# Altium footprint library custom-case.PcbLib: 381 footprints (part 20 of 24)
Each footprint in its own frame and in the unit in brackets; x right, y up, seen from the top. Pads: shape width x height; smd on the part's side, far side on the other; paste and mask are expansions set on the pad; w line width, h text height; cw(c..) or ccw(c..) is an arc to the next point about the centre after c.
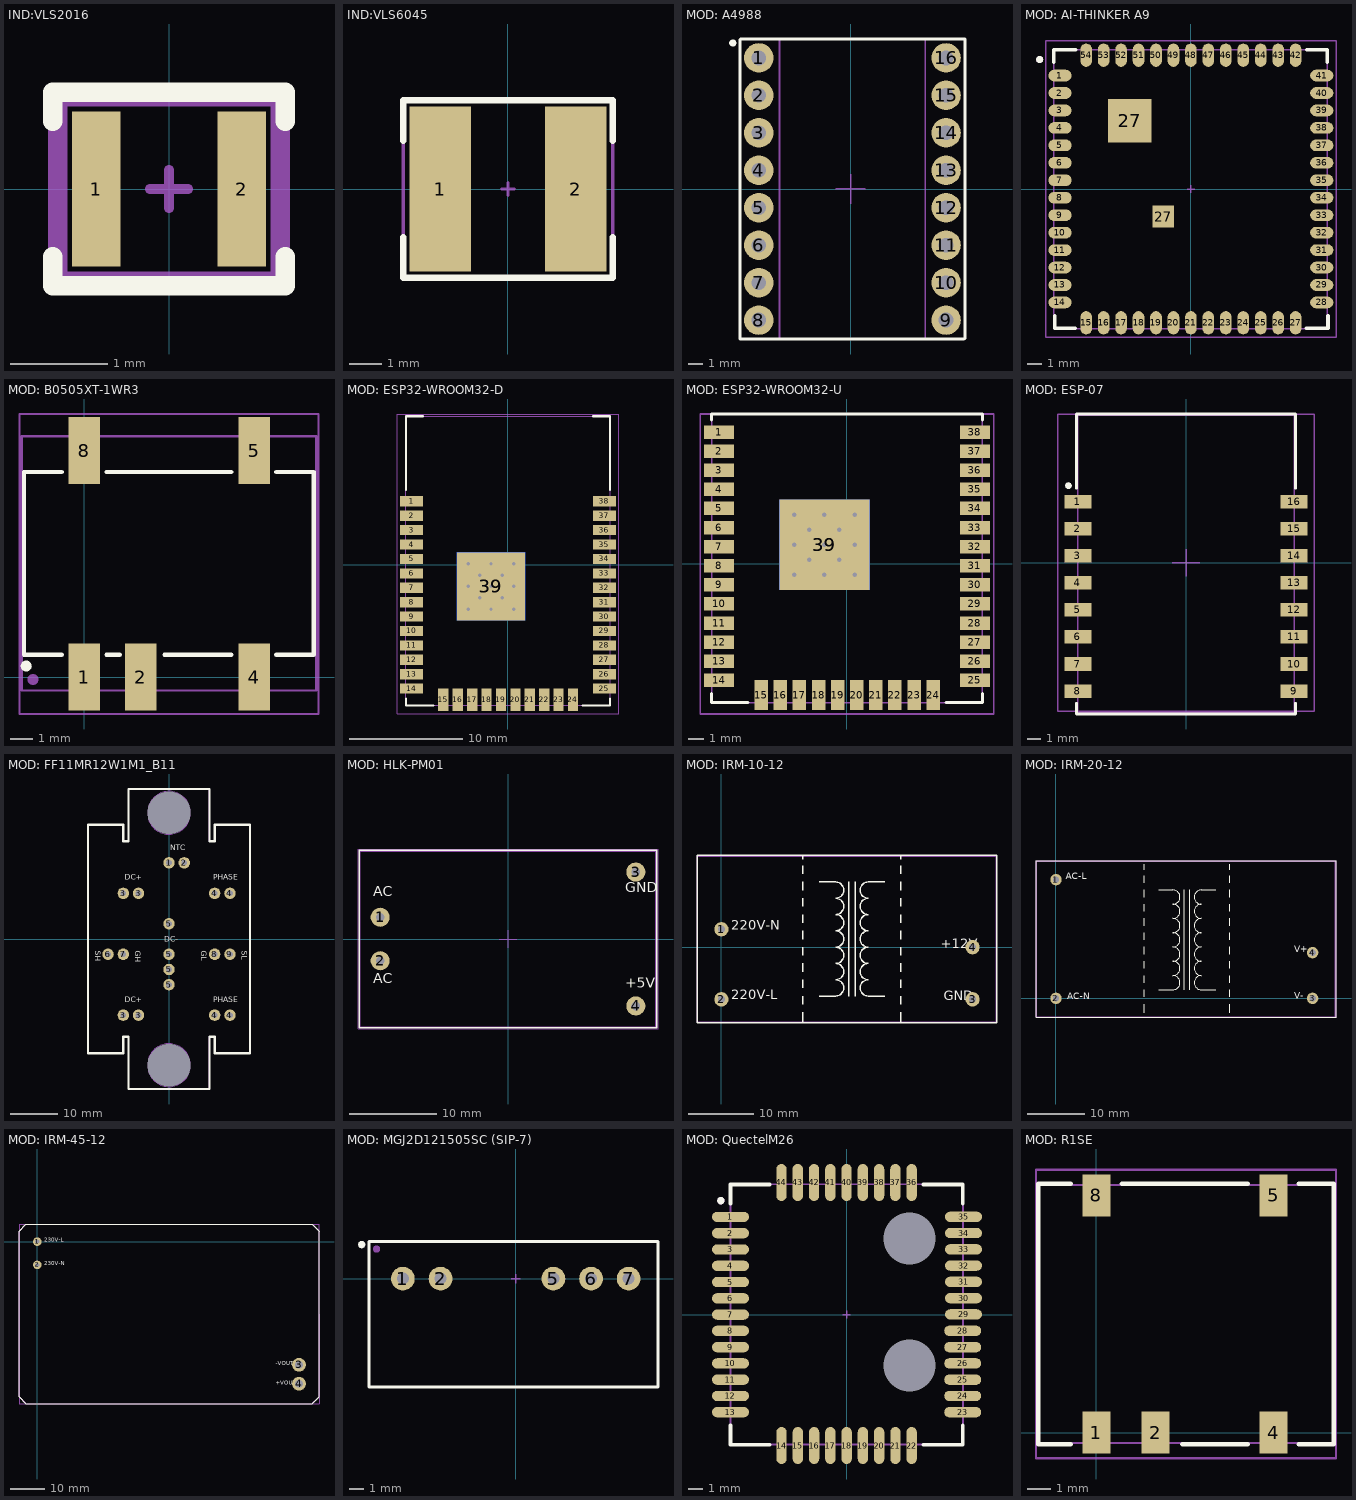
[diagram p19: the footprints below, top view; thin cyan lines are the x and y axes]

## IND:VLS2016 [mm]
pads (2):
  rect 0.5x1.6 smd: 1(-0.75,0) 2(0.75,0)
Top Overlay:
  lines w0.2: -1.2,-0.7 -1.2,-1 1.2,-1 1.2,-0.7 ; -1.2,0.7 -1.2,1 1.2,1 1.2,0.7
Top Assy:
  lines w0.1: -1.1,-0.9 1.1,-0.9 1.1,0.9 -1.1,0.9 -1.1,-0.9
Size Area:
  lines w0.1: -0.2,0 0.2,0 ; 0,-0.2 0,0.2 ; -1.2,-1 1.2,-1 1.2,1 -1.2,1 -1.2,-1
3D body "vls201610hbx-1.step": height 0.99, standoff -0.01, extent -1,-0.8 1,0.8

## IND:VLS6045 [mm]
pads (2):
  rect 1.9x5.1 smd: 1(-2.1,0) 2(2.1,0)
Top Overlay:
  lines w0.2: -3.25,-1.5 -3.25,-2.75 3.25,-2.75 3.25,-1.5 ; -3.25,1.494 -3.25,2.75 3.25,2.75 3.25,1.5
Top Assy:
  lines w0.1: -3.25,2.75 -3.25,-2.75 3.25,-2.75 3.25,2.75 -3.241,2.75
Size Area:
  lines w0.1: -0.2,0 0.2,0 ; 0,-0.2 0,0.2 ; -3.25,-2.75 3.25,-2.75 3.25,2.75 -3.25,2.75 -3.25,-2.75
3D body "vls6045ex.step": height 4.49, standoff -0.01, extent -3,-3 3,3

## MOD: A4988 [mm]
pads (17):
  round 2 hole 1: 1(-6.24,8.89) 2(-6.24,6.35) 3(-6.24,3.81) 4(-6.24,1.27) 5(-6.24,-1.27) 6(-6.24,-3.81) 7(-6.24,-6.35) 8(-6.24,-8.89) 9(6.46,-8.89) 10(6.46,-6.35) 11(6.46,-3.81) 12(6.46,-1.27) 13(6.46,1.27) 14(6.46,3.81) 15(6.46,6.35) 16(6.46,8.89)
  round 0.5 on Top Overlay: ""(-8,9.9)
Top Overlay:
  lines w0.2: -7.51,10.14 -7.51,-10.16 7.69,-10.16 ; -7.47,10.16 7.73,10.16 7.73,-10.14
Top Assy:
  lines w0.1: -7.503,-10.165 -4.834,-10.165 -4.834,10.152 -7.503,10.152 -7.503,-10.165 ; 5.054,-10.152 5.054,10.165 7.723,10.165 7.723,-10.152 5.054,-10.152
Size Area:
  lines w0.1: -1.02,0.001 0.98,0.001 ; -0.02,-0.999 -0.02,1.001 ; 5.06,10.16 7.734,10.16 ; 5.06,10.171 5.06,-10.171 7.734,-10.171 7.734,10.171 ; -7.514,-10.171 -7.514,10.158 -4.84,10.158 -4.84,-10.171 -7.514,-10.171
3D body "User Library-A4988.STEP": height 8.54, standoff -1.62, extent -7.53,-10.16 7.71,10.16

## MOD: AI-THINKER A9 [mm]
pads (58):
  oval 1.6x0.8 smd: 1(-9,7.8) 2(-9,6.6) 3(-9,5.4) 4(-9,4.2) 5(-9,3) 6(-9,1.8) 7(-9,0.6) 8(-9,-0.6) 9(-9,-1.8) 10(-9,-3) 11(-9,-4.2) 12(-9,-5.4) 13(-9,-6.6) 14(-9,-7.8) 28(9,-7.8) 29(9,-6.6) 30(9,-5.4) 31(9,-4.2) 32(9,-3) 33(9,-1.8) 34(9,-0.6) 35(9,0.6) 36(9,1.8) 37(9,3) 38(9,4.2) 39(9,5.4) 40(9,6.6) 41(9,7.8)
  oval 0.8x1.6 smd: 15(-7.2,-9.2) 16(-6,-9.2) 17(-4.8,-9.2) 18(-3.6,-9.2) 19(-2.4,-9.2) 20(-1.2,-9.2) 21(0,-9.2) 22(1.2,-9.2) 23(2.4,-9.2) 24(3.6,-9.2) 25(4.8,-9.2) 26(6,-9.2) 27(7.2,-9.2) 42(7.2,9.2) 43(6,9.2) 44(4.8,9.2) 45(3.6,9.2) 46(2.4,9.2) 47(1.2,9.2) 48(0,9.2) 49(-1.2,9.2) 50(-2.4,9.2) 51(-3.6,9.2) 52(-4.8,9.2) 53(-6,9.2) 54(-7.2,9.2)
  rect 3x3 smd: 27(-4.2,4.7)
  rect 1.5x1.5 smd: 27(-1.9,-1.9)
  round 0.5 on Mech1: ""(-10.4,8.9)
  round 0.5 on Top Overlay: ""(-10.4,8.9)
Top Overlay:
  lines w0.254: -9.434,8.71 -9.434,9.576 -7.934,9.576 ; -9.366,-8.71 -9.366,-9.576 -7.966,-9.576 ; 7.934,-9.576 9.434,-9.576 9.434,-8.71 ; 7.966,9.576 9.366,9.576 9.366,8.71
Top Assy:
  lines w0.1: -9.434,-9.624 -9.434,9.576 9.366,9.576 9.366,-9.624 -9.434,-9.624
Size Area:
  lines w0.1: -0.25,0 0.25,0 ; 0,-0.25 0,0.25 ; -9.978,-10.189 9.978,-10.189 9.978,10.151 9.978,10.189 -9.978,10.189 -9.978,-10.151 -9.978,-10.189
3D body "a9.step": height 1.8, standoff -0.16, extent -9.4,-9.6 9.4,9.6

## MOD: B0505XT-1WR3 [mm]
pads (7):
  rect 1.4x3 smd: 1(0,0) 2(2.54,0) 4(7.62,0) 5(7.62,10.16) 8(0,10.16)
  round 0.5 on Top Overlay: ""(-2.6,0.5)
  round 0.5 on Mech1: ""(-2.3,-0.1)
Top Overlay:
  lines w0.2: -1,1 -2.7,1 -2.7,9.2 -1,9.2 ; 1,1 1.6,1 ; 1,9.2 6.6,9.2 ; 3.6,1 6.6,1 ; 8.62,1 10.3,1 10.3,9.2 8.62,9.2
Top Assy:
  lines w0.1: -2.8,-0.6 -2.8,10.8 10.4,10.8 10.4,-0.6 -2.8,-0.6
Size Area:
  lines w0.1: -2.897,-1.65 10.5,-1.65 10.5,11.8 0.4,11.8 -2.897,11.8 -2.897,-1.65
3D body "1WR3.STEP": height 7.25, standoff 0, extent -2.8,-0.6 10.4,10.8

## MOD: ESP32-WROOM32-D [mm]
pads (40):
  rect 2x0.9 smd: 1(-8.5,5.6) 2(-8.5,4.33) 3(-8.5,3.06) 4(-8.5,1.79) 5(-8.5,0.52) 6(-8.5,-0.75) 7(-8.5,-2.02) 8(-8.5,-3.29) 9(-8.5,-4.56) 10(-8.5,-5.83) 11(-8.5,-7.1) 12(-8.5,-8.37) 13(-8.5,-9.64) 14(-8.5,-10.91) 25(8.5,-10.91) 26(8.5,-9.64) 27(8.5,-8.37) 28(8.5,-7.1) 29(8.5,-5.83) 30(8.5,-4.56) 31(8.5,-3.29) 32(8.5,-2.02) 33(8.5,-0.75) 34(8.5,0.52) 35(8.5,1.79) 36(8.5,3.06) 37(8.5,4.33) 38(8.5,5.6)
  rect 0.9x2 smd: 15(-5.7,-11.9) 16(-4.43,-11.9) 17(-3.16,-11.9) 18(-1.89,-11.9) 19(-0.62,-11.9) 20(0.65,-11.9) 21(1.92,-11.9) 22(3.19,-11.9) 23(4.46,-11.9) 24(5.73,-11.9)
  rect 6x6 smd far side: 39(-1.5,-1.9)
  rect 6x6 smd: 39(-1.5,-1.9)
via -3.5,-1.9 diameter 0.7 hole 0.3
via -1.5,-3.9 diameter 0.7 hole 0.3
via 0.5,-1.9 diameter 0.7 hole 0.3
via -1.5,0.1 diameter 0.7 hole 0.3
via -3.5,0.1 diameter 0.7 hole 0.3
via -3.5,-3.9 diameter 0.7 hole 0.3
via 0.5,-3.9 diameter 0.7 hole 0.3
via 0.5,0.1 diameter 0.7 hole 0.3
via -0.5,-2.9 diameter 0.7 hole 0.3
via -2.5,-2.9 diameter 0.7 hole 0.3
via -2.5,-0.9 diameter 0.7 hole 0.3
via -0.5,-0.9 diameter 0.7 hole 0.3
via -1.5,-1.9 diameter 0.7 hole 0.3
Top Overlay:
  lines w0.2: -9,-11.8 -9,-12.4 -6.6,-12.4 ; -9,6.6 -9,7.6 -9,13.1 -7.5,13.1 ; 6.6,-12.4 9,-12.4 9,-11.8 ; 7.5,13.1 9,13.1 9,7.6 9,6.6
Top Assy:
  lines w0.1: -9,-12.4 9,-12.4 ; -9,-12.4 -9,13.1 ; -9,-12.4 9,-12.4 ; -9,-12.4 -9,13.1 ; -9,13.1 9,13.1 ; -9,13.1 9,13.1 ; 9,-12.4 9,13.1 ; 9,-12.4 9,13.1
Size Area:
  lines w0.1: -0.25,0.05 0.25,0.05 ; 0,-0.2 0,0.3 ; -9.75,-13.15 -9.75,13.3 9.75,13.3 9.75,-13.15 -9.75,-13.15
3D body "User Library-ESP321.STEP": height 2.91, standoff -0.01, extent -9,-12.4 9,13.1

## MOD: ESP32-WROOM32-U [mm]
pads (40):
  rect 2x0.9 smd: 1(-8.5,8.75) 2(-8.5,7.48) 3(-8.5,6.21) 4(-8.5,4.94) 5(-8.5,3.67) 6(-8.5,2.4) 7(-8.5,1.13) 8(-8.5,-0.14) 9(-8.5,-1.41) 10(-8.5,-2.68) 11(-8.5,-3.95) 12(-8.5,-5.22) 13(-8.5,-6.49) 14(-8.5,-7.76) 25(8.5,-7.76) 26(8.5,-6.49) 27(8.5,-5.22) 28(8.5,-3.95) 29(8.5,-2.68) 30(8.5,-1.41) 31(8.5,-0.14) 32(8.5,1.13) 33(8.5,2.4) 34(8.5,3.67) 35(8.5,4.94) 36(8.5,6.21) 37(8.5,7.48) 38(8.5,8.75)
  rect 0.9x2 smd: 15(-5.7,-8.75) 16(-4.43,-8.75) 17(-3.16,-8.75) 18(-1.89,-8.75) 19(-0.62,-8.75) 20(0.65,-8.75) 21(1.92,-8.75) 22(3.19,-8.75) 23(4.46,-8.75) 24(5.73,-8.75)
  rect 6x6 smd far side: 39(-1.5,1.25)
  rect 6x6 smd: 39(-1.5,1.25)
via -1.5,1.25 diameter 0.7 hole 0.3
via -0.5,2.25 diameter 0.7 hole 0.3
via -2.5,2.25 diameter 0.7 hole 0.3
via -2.5,0.25 diameter 0.7 hole 0.3
via -0.5,0.25 diameter 0.7 hole 0.3
via 0.5,3.25 diameter 0.7 hole 0.3
via 0.5,-0.75 diameter 0.7 hole 0.3
via -3.5,-0.75 diameter 0.7 hole 0.3
via -3.5,3.25 diameter 0.7 hole 0.3
via -1.5,3.25 diameter 0.7 hole 0.3
via 0.5,1.25 diameter 0.7 hole 0.3
via -1.5,-0.75 diameter 0.7 hole 0.3
via -3.5,1.25 diameter 0.7 hole 0.3
Top Overlay:
  lines w0.2: -9,-8.65 -9,-9.25 -6.6,-9.25 ; -9,9.55 -9,9.949 9,9.949 9,9.55 ; 6.6,-9.25 9,-9.25 9,-8.65
Top Assy:
  lines w0.1: -9,-9.25 -9,9.95 ; -9,-9.25 9,-9.25 ; -9,-9.25 -9,9.95 ; -9,-9.25 9,-9.25 ; -9,9.95 9,9.95 ; -9,9.95 9,9.95 ; 9,-9.25 9,9.95 ; 9,-9.25 9,9.95
Size Area:
  lines w0.1: -0.25,0 0.25,0 ; 0,-0.25 0,0.25 ; -9.75,-10 9.75,-10 9.75,9.95 -9.75,9.95 -9.75,-10
3D body "ESp32-WROOM-32U v3.step": height 3.4, standoff -0.04, extent -9.008,-9.304 9.062,9.936

## MOD: ESP-07 [mm]
pads (17):
  rect 2x1 smd: 1(-8,4.5) 2(-8,2.5) 3(-8,0.5) 4(-8,-1.5) 5(-8,-3.5) 6(-8,-5.5) 7(-8,-7.5) 8(-8,-9.5) 9(8,-9.5) 10(8,-7.5) 11(8,-5.5) 12(8,-3.5) 13(8,-1.5) 14(8,0.5) 15(8,2.5) 16(8,4.5)
  round 0.5 on Top Overlay: ""(-8.7,5.7)
Top Overlay:
  lines w0.2: -8.1,-10.4 -8.1,-11.2 8.1,-11.2 8.1,-10.4 ; -8.1,5.5 -8.1,10.9 -8.1,11 8.1,11 8.1,5.5
Top Assy:
  lines w0.1: -8,-11.1 -8,10.9 8,10.9 8,-11.1 -8,-11.1
Size Area:
  lines w0.1: -1,0 1,0 ; 0,-1 0,1 ; -9.5,-11 9.5,-11 9.5,11 -9.5,11 -9.5,-11
3D body "User Library-ESP07-1.STEP": height 3.5, standoff -0.01, extent -8,-11.1 8,10.9

## MOD: FF11MR12W1M1_B11 [mm]
pads (20):
  round 2.4 hole 1.2: 1(0,16) 2(3.2,16) 3(-9.6,-16) 3(-9.6,9.6) 3(-6.4,-16) 3(-6.4,9.6) 4(9.6,-16) 4(9.6,9.6) 4(12.8,-16) 4(12.8,9.6) 5(0,-9.6) 5(0,-6.4) 5(0,-3.2) 5(0,3.2) 6(-12.8,-3.2) 7(-9.6,-3.2) 8(9.6,-3.2) 9(12.8,-3.2)
  round 0 hole 9: MH(0,-26.5) MH(0,26.5)
Top Overlay:
  lines w0.5: -17,-24 -9.6,-24 -9.6,-20.5 -8.5,-20.5 -8.5,-31.5 0,-31.5 8.5,-31.5 8.5,-20.5 9.6,-20.5 9.6,-24 17,-24 17,24 9.6,24 9.6,20.5 8.5,20.5 8.5,31.5 0,31.5 -8.5,31.5 -8.5,20.5 -9.6,20.5 -9.6,24 -17,24 -17,-24
  text "GL" at 6.4,-2.5 h2
  text "SL" at 14.9,-2.5 h2
  text "SH" at -15.9,-2.5 h2
  text "GH" at -7.5,-2.5 h2
  text "DC-" at -1,-1 h2
  text "DC+" at -9.25,-13.75 h2
  text "DC+" at -9.25,12 h2
  text "NTC" at 0.25,18.25 h2
  text "PHASE" at 9.25,-13.75 h2
  text "PHASE" at 9.25,12 h2
Top Assy:
  circle w0.1: c0,-26.5 r4.5
  circle w0.1: c0,26.5 r4.5
  lines w0.1: -17,-24 -9.6,-24 -9.6,-20.5 -8.5,-20.5 -8.5,-31.5 0,-31.5 8.5,-31.5 8.5,-20.5 9.6,-20.5 9.6,-24 17,-24 17,24 9.6,24 9.6,20.5 8.5,20.5 8.5,31.5 0,31.5 -8.5,31.5 -8.5,20.5 -9.6,20.5 -9.6,24 -17,24 -17,-24
3D body "FF11MR12W1M1_B11.step": height 1.4, standoff -15, extent -16.9,-31.4 16.9,31.4

## MOD: HLK-PM01 [mm]
height 15
pads (4):
  round 2.2 hole 1: 1(-14.7,2.5) 2(-14.7,-2.5) 3(14.7,7.7) 4(14.7,-7.7)
Top Overlay:
  lines w0.2: -17.1,-10.2 -0.2,-10.2 17.1,-10.2 17.1,10.2 -17.1,10.2 -17.1,-10.2
  text "AC" at -15.5,4.5 h2
  text "AC" at -15.5,-5.5 h2
  text "+5V" at 13.5,-6 h2
  text "GND" at 13.5,5 h2
Top Assy:
  lines w0.1: -17,-10.1 17,-10.1 17,10.1 -17,10.1 -17,-10.1
Size Area:
  lines w0.1: -1,0 1,0 ; 0,-1 0,1 ; -17.25,-10.35 -17.25,10.35 17.25,10.35 17.25,-10.35 -17.25,-10.35
3D body "HLK-PM01.STEP": height 15.07, standoff -4.95, extent -17,-10.1 17,10.1

## MOD: IRM-10-12 [mm]
pads (4):
  round 2.2 hole 1.1: 1(0,2.75) 2(0,-8) 3(38.5,-8) 4(38.5,0)
Top Overlay:
  lines w0.2: 12.5,-11.5 12.5,-10 ; 12.5,-8.75 12.5,-7.5 ; 12.5,-6.25 12.5,-5 ; 12.5,-3.75 12.5,-2.5 ; 12.5,-1.25 12.5,0 ; 12.5,1.25 12.5,2.5 ; 12.5,3.75 12.5,5 ; 12.5,6.25 12.5,7.5 ; 12.5,8.75 12.5,10 ; 12.5,11.25 12.5,12.5 ; 12.5,13.5 12.5,14 ; 15,-7.5 17.5,-7.5 ccw(c17.5,-6.25) 17.5,-5 ccw(c17.5,-3.75) 17.5,-2.5 ccw(c17.5,-1.25) 17.5,0 ccw(c17.5,1.25) 17.5,2.5 ccw(c17.5,3.75) 17.5,5 ccw(c17.5,6.25) 17.5,7.5 ccw(c17.5,8.75) 17.5,10 15,10 ; 19.5,-7.5 19.5,10 ; 20.5,-7.5 20.5,10 ; 25,-7.5 22.5,-7.5 cw(c22.5,-6.25) 22.5,-5 cw(c22.5,-3.75) 22.5,-2.5 cw(c22.5,-1.25) 22.5,0 cw(c22.5,1.25) 22.5,2.5 cw(c22.5,3.75) 22.5,5 cw(c22.5,6.25) 22.5,7.5 cw(c22.5,8.75) 22.5,10 25,10 ; 27.5,-11.5 27.5,-10 ; 27.5,-8.75 27.5,-7.5 ; 27.5,-6.25 27.5,-5 ; 27.5,-3.75 27.5,-2.5 ; 27.5,-1.25 27.5,0 ; 27.5,1.25 27.5,2.5 ; 27.5,3.75 27.5,5 ; 27.5,6.25 27.5,7.5 ; 27.5,8.75 27.5,10 ; 27.5,11.25 27.5,12.5 ; 27.5,13.5 27.5,14 ; -3.75,-11.6 -3.75,14.1 42.25,14.1 42.25,-11.6 -3.75,-11.6
  text "GND" at 34.1,-8.7 h2.5
  text "+12V" at 33.6,-0.7 h2.5
  text "220V-L" at 1.5,-8.5 h2.5
  text "220V-N" at 1.5,2.1 h2.5
Top Assy:
  lines w0.1: -3.6,-11.45 42.099,-11.45 42.099,13.95 -3.6,13.95 -3.6,-11.45
Size Area:
  lines w0.1: -3.7,-11.55 -3.7,14.05 42.2,14.05 42.2,-11.55 -3.7,-11.55
3D body "User Library-IRM-10-12.STEP": height 22.05, standoff -3.5, extent -3.6,-11.45 42.099,13.95

## MOD: IRM-20-12 [mm]
pads (4):
  round 2 hole 1.1: 1(0,20.8) 2(0,0) 3(45,0) 4(45,8)
Top Overlay:
  lines w0.2: 15.5,-2.5 15.5,-1 ; 15.5,0.25 15.5,1.5 ; 15.5,2.75 15.5,4 ; 15.5,5.25 15.5,6.5 ; 15.5,7.75 15.5,9 ; 15.5,10.25 15.5,11.5 ; 15.5,12.75 15.5,14 ; 15.5,15.25 15.5,16.5 ; 15.5,17.75 15.5,19 ; 15.5,20.25 15.5,21.5 ; 15.5,22.5 15.5,23.5 ; 18,1.5 20.5,1.5 ccw(c20.5,2.75) 20.5,4 ccw(c20.5,5.25) 20.5,6.5 ccw(c20.5,7.75) 20.5,9 ccw(c20.5,10.25) 20.5,11.5 ccw(c20.5,12.75) 20.5,14 ccw(c20.5,15.25) 20.5,16.5 ccw(c20.5,17.75) 20.5,19 18,19 ; 22.5,1.5 22.5,19 ; 23.5,1.5 23.5,19 ; 28,1.5 25.5,1.5 cw(c25.5,2.75) 25.5,4 cw(c25.5,5.25) 25.5,6.5 cw(c25.5,7.75) 25.5,9 cw(c25.5,10.25) 25.5,11.5 cw(c25.5,12.75) 25.5,14 cw(c25.5,15.25) 25.5,16.5 cw(c25.5,17.75) 25.5,19 28,19 ; 30.5,-2.5 30.5,-1 ; 30.5,0.25 30.5,1.5 ; 30.5,2.75 30.5,4 ; 30.5,5.25 30.5,6.5 ; 30.5,7.75 30.5,9 ; 30.5,10.25 30.5,11.5 ; 30.5,12.75 30.5,14 ; 30.5,15.25 30.5,16.5 ; 30.5,17.75 30.5,19 ; 30.5,20.25 30.5,21.5 ; 30.5,22.5 30.5,23.5 ; -3.5,-3.3 49.1,-3.3 49.1,24.1 -3.5,24.1 -3.5,-3.3
  text "V+" at 41.8,7.6 h2
  text "V-" at 41.8,-0.5 h2
  text "AC-N" at 2,-0.6 h2
  text "AC-L" at 1.7,20.4 h2
Top Assy:
  lines w0.1: -3.4,-3.2 49,-3.2 49,24 -3.4,24 -3.4,-3.2
  text "V+" at 41.8,7.6 h2
  text "V-" at 41.8,-0.5 h2
  text "AC-N" at 2,-0.6 h2
  text "AC-L" at 1.7,20.4 h2
Size Area:
  lines w0.1: -3.5,-3.3 -3.5,24.1 49.1,24.1 49.1,-3.3 -3.5,-3.3
3D body "IRM-20-12.STEP": height 24, standoff -3, extent -3.4,-3.2 49,24

## MOD: IRM-45-12 [mm]
pads (4):
  round 2.5 hole 1.2: 1(0,0) 2(0,-6.75)
  round 4 hole 2.2: 3(76,-35.75) 4(76,-41.25)
Top Overlay:
  lines w0.2: -5.3,3 -5.3,-45.05 -3.3,-47.05 79.8,-47.05 81.8,-45.05 81.8,3 79.8,5 -3.3,5 -5.3,3 ; -5.3,3 -5.3,3
  text "-VOUT" at 69.25,-36.25 h2
  text "+VOUT" at 69.25,-42 h2
  text "230V-L" at 2,-0.5 h2
  text "230V-N" at 2,-7.25 h2
Top Assy:
  lines w0.1: -5.3,-45.05 -3.25,-47.1 79.75,-47.1 81.8,-45.05 81.8,3 79.8,5 -3.3,5 -5.3,3 -5.3,-45.05
  text "-VOUT" at 69.25,-36.25 h2
  text "+VOUT" at 69.25,-42 h2
  text "230V-N" at 2,-7.25 h2
  text "230V-L" at 2,-0.5 h2
Size Area:
  lines w0.1: -5.3,-47.1 -5.3,5.1 81.8,5.1 81.8,-47.1 -5.3,-47.1
3D body "IRM-45-15.step": height 29.51, standoff -3.5, extent -5.25,-47 81.75,5

## MOD: MGJ2D121505SC (SIP-7) [mm]
pads (7):
  round 1.6 hole 0.8: 1(-7.62,0) 2(-5.08,0) 5(2.54,0) 6(5.08,0) 7(7.62,0)
  round 0.5 on Top Overlay: ""(-10.4,2.3)
  round 0.5 on Mech1: ""(-9.4,2)
Top Overlay:
  lines w0.2: -9.9,-7.32 -9.9,2.5 9.6,2.5 9.6,-7.32 -9.9,-7.32
Top Assy:
  lines w0.1: -9.9,-7.32 -9.9,2.5 9.6,2.5 9.6,-7.32 -9.9,-7.32
Size Area:
  lines w0.1: -0.3,0 0.3,0 ; 0,-0.3 0,0.3 ; -9.9,-7.32 -9.9,2.5 9.6,2.5 9.6,-7.32 -9.9,-7.32
3D body "mps_dcdc_mgj2d_sc_a.step": height 12.6, standoff -4, extent -9.9,-7.32 9.6,2.5

## MOD: QuectelM26 [mm]
pads (48):
  oval 2.5x0.7 smd: 1(-7.85,6.6) 2(-7.85,5.5) 3(-7.85,4.4) 4(-7.85,3.3) 5(-7.85,2.2) 6(-7.85,1.1) 7(-7.85,0) 8(-7.85,-1.1) 9(-7.85,-2.2) 10(-7.85,-3.3) 11(-7.85,-4.4) 12(-7.85,-5.5) 13(-7.85,-6.6) 23(7.847,-6.6) 24(7.847,-5.5) 25(7.847,-4.4) 26(7.847,-3.3) 27(7.847,-2.2) 28(7.847,-1.1) 29(7.901,0.012) 30(7.901,1.112) 31(7.901,2.212) 32(7.901,3.312) 33(7.901,4.412) 34(7.901,5.512) 35(7.901,6.612)
  oval 0.7x2.5 smd: 14(-4.4,-8.85) 15(-3.3,-8.85) 16(-2.2,-8.85) 17(-1.1,-8.85) 18(0,-8.85) 19(1.1,-8.85) 20(2.2,-8.85) 21(3.3,-8.85) 22(4.4,-8.85) 36(4.396,8.929) 37(3.296,8.929) 38(2.196,8.929) 39(1.096,8.929) 40(-0.004,8.929) 41(-1.104,8.929) 42(-2.204,8.929) 43(-3.304,8.929) 44(-4.404,8.929)
  round 0.5 on Mech1: ""(-8.5,7.7)
  round 0.5 on Top Overlay: ""(-8.5,7.7)
  round 1.2 hole 3.5: ""(4.25,-3.45) ""(4.25,5.15)
Top Overlay:
  lines w0.254: -7.853,-7.5 -7.853,-8.8 -5.203,-8.8 ; -7.85,7.5 -7.85,8.8 -5.2,8.8 ; 5.197,-8.8 7.847,-8.8 7.847,-7.5 ; 5.2,8.8 7.85,8.8 ; 7.85,7.5 7.85,8.8 ; 7.85,8.8 7.85,8.8
Top Assy:
  lines w0.1: -7.85,-8.763 7.85,-8.763 7.85,8.8 -7.85,8.8 -7.85,-8.763
Size Area:
  lines w0.1: -0.25,0 0.25,0 ; 0,-0.25 0,0.25 ; -7.823,-8.788 7.874,-8.788 7.874,8.8 -7.823,8.8 -7.823,-8.788
3D body "M26.stp": height 2.3, standoff 0, extent -7.9,-8.85 7.9,8.85

## MOD: R1SE [mm]
pads (5):
  rect 1.2x1.8 smd: 1(0,0) 2(2.54,0) 4(7.62,0) 5(7.62,10.2) 8(0,10.2)
Top Overlay:
  lines w0.2: -1.1,-0.5 -2.5,-0.5 -2.5,10.7 -1.1,10.7 ; 1.1,10.7 6.5,10.7 ; 3.7,-0.5 6.5,-0.5 ; 8.7,-0.5 10.2,-0.5 10.2,10.7 8.7,10.7
Top Assy:
  lines w0.1: -2.525,-0.45 -2.525,10.65 10.225,10.65 10.225,-0.45 -2.525,-0.45
Size Area:
  lines w0.1: -2.6,-1.1 10.3,-1.1 10.3,11.3 -2.6,11.3 -2.6,-1.1
3D body "User Library-RECOM_R1S-xxxx.STEP": height 7, standoff 0, extent -2.525,-0.45 10.225,10.65